# Altium footprint library Angler.PcbLib: 331 footprints (part 14 of 21)
Each footprint in its own frame and in the unit in brackets; x right, y up, seen from the top. Pads: shape width x height; smd on the part's side, far side on the other; paste and mask are expansions set on the pad; w line width, h text height; cw(c..) or ccw(c..) is an arc to the next point about the centre after c.
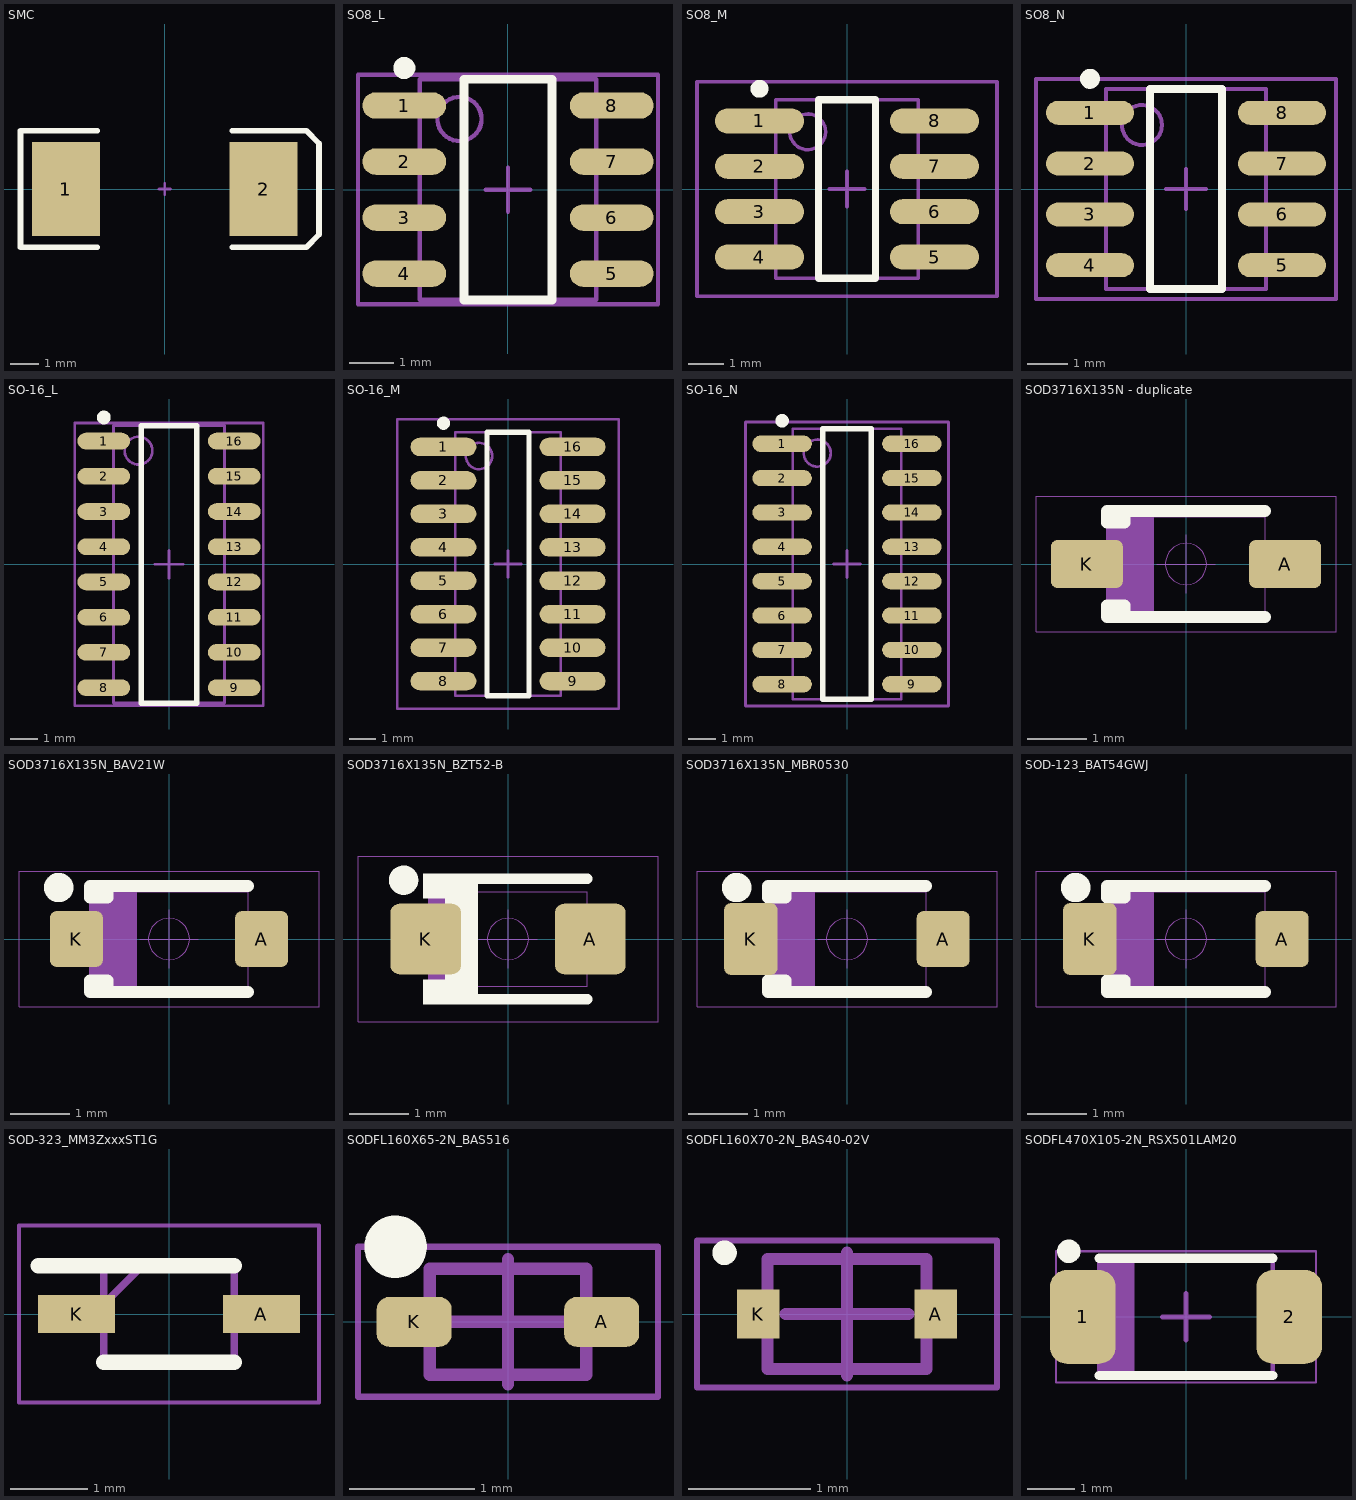
[diagram p13: the footprints below, top view; thin cyan lines are the x and y axes]

## SMC [mm] "DO-214-AB/SMC; 2 C-Bend Leads; Body 7.9 x 5.9 mm, inc. leads (LxW)"
height 2.65
pads (2):
  rect 2.4x3.3 smd: 1(-3.475,0) 2(3.475,0)
Top Overlay:
  lines w0.2: -2.375,-2.05 -5.075,-2.05 -5.075,2.05 -2.375,2.05 ; 2.375,-2.05 4.975,-2.05 5.425,-1.6 5.425,1.6 4.975,2.055 ; 2.375,2.05 4.975,2.05
Mechanical 1:
  lines w0.1: -0.2,0 0.2,0 ; 0,-0.2 0,0.2

## SO8_L [mm] "SOIC, 8-Leads, Body 4.9x3.9mm, Pitch 1.27mm, IPC High Density"
height 1.75
pads (8):
  oval 1.9x0.6 smd: 1(-2.35,1.905) 2(-2.35,0.635) 3(-2.35,-0.635) 4(-2.35,-1.905) 5(2.35,-1.905) 6(2.35,-0.635) 7(2.35,0.635) 8(2.35,1.905)
Top Overlay:
  circle w0.25: c-2.35,2.755 r0.125
  lines w0.2: -1,-2.5 -1,2.5 1,2.5 1,-2.5 -1,-2.5
Mechanical 13:
  circle w0.1: c-1.1,1.6 r0.5
  lines w0.1: -2,-2.5 -2,2.5 2,2.5 2,-2.5 -2,-2.5
Mechanical 15:
  lines w0.1: -0.5,0 0.5,0 ; 0,-0.5 0,0.5 ; -3.4,-2.6 -3.4,2.6 3.4,2.6 3.4,-2.6 -3.4,-2.6
3D body: height 1.75, standoff 0, extent -2,-2.5 2,2.5

## SO8_M [mm] "SOIC, 8-Leads, Body 4.9x3.9mm, Pitch 1.27mm, IPC Low Density"
height 1.75
pads (8):
  oval 2.5x0.7 smd: 1(-2.45,1.905) 2(-2.45,0.635) 3(-2.45,-0.635) 4(-2.45,-1.905) 5(2.45,-1.905) 6(2.45,-0.635) 7(2.45,0.635) 8(2.45,1.905)
Top Overlay:
  circle w0.25: c-2.45,2.805 r0.125
  lines w0.2: -0.8,-2.5 0.8,-2.5 0.8,2.5 -0.8,2.5 -0.8,-2.5
Mechanical 13:
  circle w0.1: c-1.1,1.6 r0.5
  lines w0.1: -2,-2.5 2,-2.5 2,2.5 -2,2.5 -2,-2.5
Mechanical 15:
  lines w0.1: -0.5,0 0.5,0 ; 0,-0.5 0,0.5 ; -4.2,-3 4.2,-3 4.2,3 -4.2,3 -4.2,-3
3D body: height 1.75, standoff 0, extent -2,-2.5 2,2.5

## SO8_N [mm] "SOIC, 8-Leads, Body 4.9x3.9mm, Pitch 1.27mm, IPC Medium Density"
height 1.75
pads (8):
  oval 2.2x0.6 smd: 1(-2.4,1.905) 2(-2.4,0.635) 3(-2.4,-0.635) 4(-2.4,-1.905) 5(2.4,-1.905) 6(2.4,-0.635) 7(2.4,0.635) 8(2.4,1.905)
Top Overlay:
  circle w0.25: c-2.4,2.755 r0.125
  lines w0.2: -0.9,-2.5 0.9,-2.5 0.9,2.5 -0.9,2.5 -0.9,-2.5
Mechanical 13:
  circle w0.1: c-1.1,1.6 r0.5
  lines w0.1: -2,-2.5 2,-2.5 2,2.5 -2,2.5 -2,-2.5
Mechanical 15:
  lines w0.1: -0.5,0 0.5,0 ; 0,-0.5 0,0.5 ; -3.75,-2.75 3.75,-2.75 3.75,2.75 -3.75,2.75 -3.75,-2.75
3D body: height 1.75, standoff 0, extent -2,-2.5 2,2.5

## SO-16_L [mm] "SOIC, 16-Leads, Body 9.9x3.9mm, Pitch 1.27mm, IPC High Density"
height 1.75
pads (16):
  oval 1.9x0.6 smd: 1(-2.35,4.445) 2(-2.35,3.175) 3(-2.35,1.905) 4(-2.35,0.635) 5(-2.35,-0.635) 6(-2.35,-1.905) 7(-2.35,-3.175) 8(-2.35,-4.445) 9(2.35,-4.445) 10(2.35,-3.175) 11(2.35,-1.905) 12(2.35,-0.635) 13(2.35,0.635) 14(2.35,1.905) 15(2.35,3.175) 16(2.35,4.445)
Top Overlay:
  circle w0.25: c-2.35,5.295 r0.125
  lines w0.2: -1,-5 -1,5 1,5 1,-5 -1,-5
Mechanical 13:
  circle w0.1: c-1.1,4.1 r0.5
  lines w0.1: -2,-5 -2,5 2,5 2,-5 -2,-5
Mechanical 15:
  lines w0.1: -0.5,0 0.5,0 ; 0,-0.5 0,0.5 ; -3.4,-5.1 -3.4,5.1 3.4,5.1 3.4,-5.1 -3.4,-5.1
3D body: height 1.75, standoff 0, extent -2,-5 2,5

## SO-16_M [mm] "SOIC, 16-Leads, Body 9.9x3.9mm, Pitch 1.27mm, IPC Low Density"
height 1.75
pads (16):
  oval 2.5x0.7 smd: 1(-2.45,4.445) 2(-2.45,3.175) 3(-2.45,1.905) 4(-2.45,0.635) 5(-2.45,-0.635) 6(-2.45,-1.905) 7(-2.45,-3.175) 8(-2.45,-4.445) 9(2.45,-4.445) 10(2.45,-3.175) 11(2.45,-1.905) 12(2.45,-0.635) 13(2.45,0.635) 14(2.45,1.905) 15(2.45,3.175) 16(2.45,4.445)
Top Overlay:
  circle w0.25: c-2.45,5.345 r0.125
  lines w0.2: -0.8,-5 0.8,-5 0.8,5 -0.8,5 -0.8,-5
Mechanical 13:
  circle w0.1: c-1.1,4.1 r0.5
  lines w0.1: -2,-5 2,-5 2,5 -2,5 -2,-5
Mechanical 15:
  lines w0.1: -0.5,0 0.5,0 ; 0,-0.5 0,0.5 ; -4.2,-5.5 4.2,-5.5 4.2,5.5 -4.2,5.5 -4.2,-5.5
3D body: height 1.75, standoff 0, extent -2,-5 2,5

## SO-16_N [mm] "SOIC, 16-Leads, Body 9.9x3.9mm, Pitch 1.27mm, IPC Medium Density"
height 1.75
pads (16):
  oval 2.2x0.6 smd: 1(-2.4,4.445) 2(-2.4,3.175) 3(-2.4,1.905) 4(-2.4,0.635) 5(-2.4,-0.635) 6(-2.4,-1.905) 7(-2.4,-3.175) 8(-2.4,-4.445) 9(2.4,-4.445) 10(2.4,-3.175) 11(2.4,-1.905) 12(2.4,-0.635) 13(2.4,0.635) 14(2.4,1.905) 15(2.4,3.175) 16(2.4,4.445)
Top Overlay:
  circle w0.25: c-2.4,5.295 r0.125
  lines w0.2: -0.9,-5 -0.9,5 0.9,5 0.9,-5 -0.9,-5
Mechanical 13:
  circle w0.1: c-1.1,4.1 r0.5
  lines w0.1: -2,-5 -2,5 2,5 2,-5 -2,-5
Mechanical 15:
  lines w0.1: -0.5,0 0.5,0 ; 0,-0.5 0,0.5 ; -3.75,-5.25 -3.75,5.25 3.75,5.25 3.75,-5.25 -3.75,-5.25
3D body: height 1.75, standoff 0, extent -2,-5 2,5

## SOD3716X135N - duplicate [mm] "SOD123 2.69mm W X 1.60mm L X 1.35mm H body"
height 1.35
pads (2):
  rrect25% 1.22x0.81 smd mask+0.064: A(1.685,0) K(-1.685,0)
Top Overlay:
  lines w0.2: -1.045,-0.9 -1.045,-0.7 -1.345,-0.7 -1.345,-0.9 1.345,-0.9 ; -1.045,0.9 -1.045,0.7 -1.345,0.7 -1.345,0.9 1.345,0.9
Mechanical 9:
  region: -1.345,0.8 -0.552,0.8 -0.552,-0.8 -1.345,-0.8
  lines w0.01: -1.345,-0.8 -1.345,0.8 1.345,0.8 1.345,-0.8 -1.345,-0.8
Mechanical 11:
  text ".Designator" at -0.9,-0.2 h1
Mechanical 15:
  circle w0.01: c0,0 r0.35
  lines w0.01: -0.5,0 0.5,0 ; 0,-0.5 0,0.5 ; -2.55,-1.15 2.55,-1.15 2.55,1.15 -2.55,1.15 -2.55,-1.15
3D body "SOD-123.stp": height 1.35, standoff 0, extent -1.93,-0.902 1.93,0.902

## SOD3716X135N_BAV21W [mm] "SOD123 2.65x1.55x1.35mm Body"
height 1.35
pads (2):
  rrect25% 0.9x0.95 smd mask+0.064: A(1.575,0) K(-1.575,0)
Top Overlay:
  circle w0.25: c-1.875,0.875 r0.125
  lines w0.2: -1.045,-0.9 -1.045,-0.7 -1.345,-0.7 -1.345,-0.9 1.345,-0.9 ; -1.045,0.9 -1.045,0.7 -1.345,0.7 -1.345,0.9 1.345,0.9
Mechanical 9:
  region: -1.345,0.8 -0.552,0.8 -0.552,-0.8 -1.345,-0.8
  lines w0.01: -1.345,-0.8 1.345,-0.8 1.345,0.8 -1.345,0.8 -1.345,-0.8
Mechanical 11:
  text ".Designator" at -0.9,-0.2 h1
Mechanical 15:
  circle w0.01: c0,0 r0.35
  lines w0.01: -0.5,0 0.5,0 ; 0,-0.5 0,0.5 ; -2.55,-1.15 -2.55,1.15 2.55,1.15 2.55,-1.15 -2.55,-1.15
3D body "sod123 v4.step": height 1.2, standoff 0, extent -1.875,-0.85 1.875,0.85

## SOD3716X135N_BZT52-B [mm] "SOD123 2.69mm W X 1.60mm L X 1.35mm H body"
height 1.35
pads (2):
  rrect25% 1.2x1.2 smd mask+0.064: A(1.4,0) K(-1.4,0)
Top Overlay:
  circle w0.25: c-1.775,1 r0.125
  rectangle: -1.067,-1.067 -0.508,1.067
  rectangle: -1.448,-1.118 -0.813,-0.686
  rectangle: -1.448,0.686 -0.813,1.118
  lines w0.178: -1.345,-1.027 1.345,-1.027 ; -1.345,1.027 1.345,1.027
Mechanical 9:
  region: -1.345,0.8 -0.552,0.8 -0.552,-0.8 -1.345,-0.8
  lines w0.01: -1.345,-0.8 1.345,-0.8 1.345,0.8 -1.345,0.8 -1.345,-0.8
Mechanical 11:
  text ".Designator" at -0.9,-0.2 h1
Mechanical 15:
  circle w0.01: c0,0 r0.35
  lines w0.01: -0.5,0 0.5,0 ; 0,-0.5 0,0.5 ; -2.55,-1.404 -2.55,1.404 2.55,1.404 2.55,-1.404 -2.55,-1.404
3D body "SODFL350X120-2N.step": height 1.2, standoff 0, extent -1.75,-0.85 1.75,0.85

## SOD3716X135N_MBR0530 [mm] "SOD123 2.65x1.55x1.35mm Body"
height 1.35
pads (2):
  rrect25% 0.9x0.95 smd mask+0.064: A(1.635,0)
  rrect25% 0.91x1.22 smd mask+0.064: K(-1.635,0)
Top Overlay:
  circle w0.25: c-1.875,0.875 r0.125
  lines w0.2: -1.045,-0.9 -1.045,-0.7 -1.345,-0.7 -1.345,-0.9 1.345,-0.9 ; -1.045,0.9 -1.045,0.7 -1.345,0.7 -1.345,0.9 1.345,0.9
Mechanical 9:
  region: -1.345,0.8 -0.552,0.8 -0.552,-0.8 -1.345,-0.8
  lines w0.01: -1.345,-0.8 1.345,-0.8 1.345,0.8 -1.345,0.8 -1.345,-0.8
Mechanical 11:
  text ".Designator" at -0.9,-0.2 h1
Mechanical 15:
  circle w0.01: c0,0 r0.35
  lines w0.01: -0.5,0 0.5,0 ; 0,-0.5 0,0.5 ; -2.55,-1.15 -2.55,1.15 2.55,1.15 2.55,-1.15 -2.55,-1.15
3D body "sod123 v4.step": height 1.2, standoff 0, extent -1.875,-0.85 1.875,0.85

## SOD-123_BAT54GWJ [mm] "SOD123 2.65x1.60x1.30mm Body"
height 1.3
pads (2):
  rrect25% 0.9x0.95 smd mask+0.064: A(1.635,0)
  rrect25% 0.91x1.22 smd mask+0.064: K(-1.635,0)
Top Overlay:
  circle w0.25: c-1.875,0.875 r0.125
  lines w0.2: -1.045,-0.9 -1.045,-0.7 -1.345,-0.7 -1.345,-0.9 1.345,-0.9 ; -1.045,0.9 -1.045,0.7 -1.345,0.7 -1.345,0.9 1.345,0.9
Mechanical 9:
  region: -1.345,0.8 -0.552,0.8 -0.552,-0.8 -1.345,-0.8
  lines w0.01: -1.345,-0.8 1.345,-0.8 1.345,0.8 -1.345,0.8 -1.345,-0.8
Mechanical 11:
  text ".Designator" at -0.9,-0.2 h1
Mechanical 15:
  circle w0.01: c0,0 r0.35
  lines w0.01: -0.5,0 0.5,0 ; 0,-0.5 0,0.5 ; -2.55,-1.15 -2.55,1.15 2.55,1.15 2.55,-1.15 -2.55,-1.15
3D body "sod123 v4.step": height 1.2, standoff 0, extent -1.875,-0.85 1.875,0.85

## SOD-323_MM3ZxxxST1G [mm]
height 0.9
pads (2):
  rect 1x0.5 smd: A(1.2,0) K(-1.2,0)
Top Overlay:
  lines w0.2: -1.7,0.625 0.85,0.625 ; -0.85,-0.625 0.85,-0.625
Mechanical 13:
  lines w0.1: -0.85,0.125 -0.35,0.625 ; -0.85,-0.625 0.85,-0.625 0.85,0.625 -0.85,0.625 -0.85,-0.625
Mechanical 15:
  lines w0.05: -1.95,-1.15 1.95,-1.15 1.95,1.15 -1.95,1.15 -1.95,-1.15
3D body "MM3Z10VST1G.stp": height 1.1, standoff 0, extent -1.25,-0.625 1.25,0.625

## SODFL160X65-2N_BAS516 [mm] "SODFL, 2-Leads, Body 0.80x1.60mm, IPC Medium Density"
height 0.65
pads (2):
  rrect50% 0.6x0.4 smd paste-0.05: A(0.75,0)
  rrect50% 0.6x0.4 smd paste-0.05 mask+0.102: K(-0.75,0)
Top Overlay:
  circle w0.25: c-0.9,0.6 r0.125
Mechanical 9:
  lines w0.1: -0.625,-0.425 -0.625,0.425 0.625,0.425 0.625,-0.425 -0.625,-0.425
Mechanical 11:
  text "'.Designator'" at -0.5,-0.25 h0.5
Mechanical 15:
  lines w0.05: -1.2,-0.6 -1.2,0.6 1.2,0.6 1.2,-0.6 -1.2,-0.6
  lines w0.1: -0.5,0 0.5,0 ; 0,-0.5 0,0.5
3D body "SODFL160X65-2N.step": height 0.65, standoff 0, extent -0.8,-0.425 0.8,0.425

## SODFL160X70-2N_BAS40-02V [mm] "SODFL, 2-Leads, Body 0.80x1.60mm, IPC Medium Density"
height 0.7
pads (2):
  rect 0.35x0.4 smd: A(0.725,0) K(-0.725,0)
Top Overlay:
  circle w0.1: c-1,0.5 r0.05
Mechanical 9:
  lines w0.1: -0.65,-0.45 -0.65,0.45 0.65,0.45 0.65,-0.45 -0.65,-0.45
Mechanical 11:
  text ".DESIGNATOR" at -0.325,-0.125 h0.25
Mechanical 15:
  lines w0.05: -1.225,-0.6 -1.225,0.6 1.225,0.6 1.225,-0.6 -1.225,-0.6
  lines w0.1: -0.5,0 0.5,0 ; 0,-0.5 0,0.5
3D body "SODFL160X70-2N.step": height 0.7, standoff 0, extent -0.8,-0.45 0.8,0.45

## SODFL470X105-2N_RSX501LAM20 [mm] "SODFL, 2-Leads, Body 2.40x4.70mm, IPC Medium Density"
height 1.05
pads (2):
  rrect50% 1.4x2 smd: 1(-2.2,0) 2(2.2,0)
Top Overlay:
  circle w0.25: c-2.5,1.4 r0.125
  lines w0.2: -1.85,-1.25 1.85,-1.25 ; -1.85,1.25 1.85,1.25
Mechanical 9:
  rectangle: -1.85,-1.25 -1.1,1.25
  lines w0.1: -1.85,-1.25 -1.85,1.25 1.85,1.25 1.85,-1.25 -1.85,-1.25
Mechanical 11:
  text ".Designator" at -0.65,-0.25 h0.5
Mechanical 15:
  lines w0.05: -2.775,-1.4 -2.775,1.4 2.775,1.4 2.775,-1.4 -2.775,-1.4
  lines w0.1: -0.5,0 0.5,0 ; 0,-0.5 0,0.5
3D body "SODFL470X105-2N.step": height 1.05, standoff 0, extent -2.35,-1.25 2.35,1.25